# Altium footprint library LDCN Components.PcbLib: 426 footprints (part 15 of 27)
Each footprint in its own frame and in the unit in brackets; x right, y up, seen from the top. Pads: shape width x height; smd on the part's side, far side on the other; paste and mask are expansions set on the pad; w line width, h text height; cw(c..) or ccw(c..) is an arc to the next point about the centre after c.
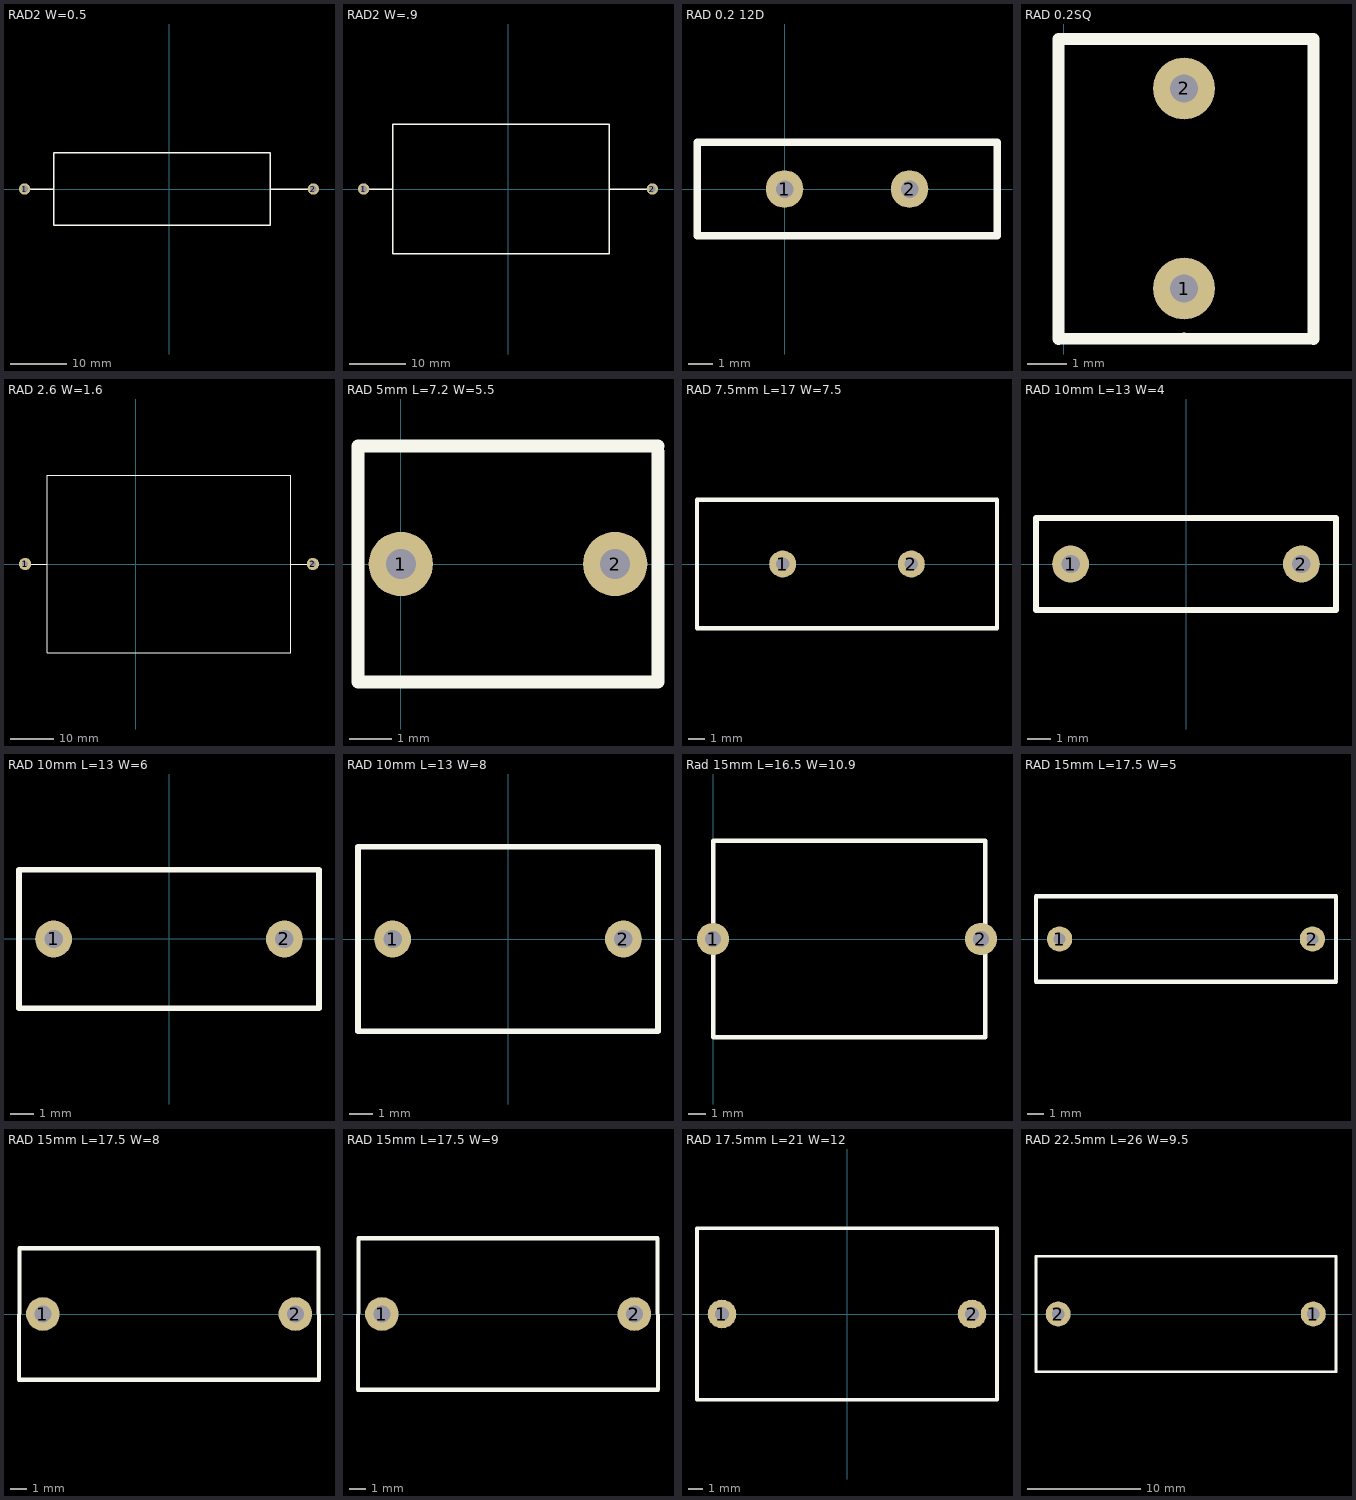
[diagram p14: the footprints below, top view; thin cyan lines are the x and y axes]

## RAD2 W=0.5 [mm]
height 10
pads (2):
  round 2 hole 1.2: 1(-25.4,0) 2(25.4,0)
Top Overlay:
  lines w0.254: -25.4,0 -20.32,0 ; 17.78,0 25.4,0 ; -20.32,-6.35 -20.32,6.35 17.78,6.35 17.78,-6.35 -20.32,-6.35

## RAD2 W=.9 [mm]
height 10
pads (2):
  round 2 hole 1.2: 1(-25.4,0) 2(25.4,0)
Top Overlay:
  lines w0.254: -25.4,0 -20.32,0 ; 17.78,0 25.4,0 ; -20.32,-11.43 -20.32,11.43 17.78,11.43 17.78,-11.43 -20.32,-11.43

## RAD 0.2 12D [mil] "5mm Lead spacing, 12mm Round Diameter"
pads (2):
  round 60 hole 28: 1(0,0) 2(200,0)
Top Overlay:
  lines w12: -140,-75 -140,75 340,75 340,-75 -140,-75

## RAD 0.2SQ [mil]
height 500
pads (2):
  round 62 hole 28: 1(120.5,270.5) 2(120.5,470.5)
Top Overlay:
  lines w12: -5,220 120.5,220.5 250,220 250,520 -5,520 -5,220

## RAD 2.6 W=1.6 [mm]
height 16
pads (2):
  round 2.8 hole 1.4: 1(-25.4,0) 2(40.64,0)
Top Overlay:
  lines w0.254: -25.4,0 -20.32,0 ; 35.56,0 40.64,0 ; -20.32,-20.32 -20.32,20.32 35.56,20.32 35.56,-20.32 -20.32,-20.32

## RAD 5mm L=7.2 W=5.5 [mil]
pads (2):
  round 60 hole 28: 1(0,0) 2(200,0)
Top Overlay:
  lines w12: 240,105 240,-110 -40,-110 -40,110 240,110

## RAD 7.5mm L=17 W=7.5 [mm] "Panasonic ECQP Series"
height 17.5
pads (2):
  round 1.6 hole 0.8: 1(-25.4,0) 2(-17.78,0)
Top Overlay:
  lines w0.254: -30.48,-3.81 -30.48,3.81 -12.7,3.81 -12.7,-3.81 -30.48,-3.81

## RAD 10mm L=13 W=4 [mm] "0.8mm Hole"
height 10
pads (2):
  round 1.6 hole 0.8: 1(-5,0) 2(5,0)
Top Overlay:
  lines w0.254: -6.5,-2 6.5,-2 6.5,2 -6.5,2 -6.5,-2

## RAD 10mm L=13 W=6 [mm] "0.8mm Hole"
height 10
pads (2):
  round 1.6 hole 0.8: 1(-5,0) 2(5,0)
Top Overlay:
  lines w0.254: -6.5,-3 -6.5,3 6.5,3 6.5,-3 -6.5,-3

## RAD 10mm L=13 W=8 [mm] "0.8mm Hole"
height 10
pads (2):
  round 1.6 hole 0.8: 1(-5,0) 2(5,0)
Top Overlay:
  lines w0.254: -6.5,-4 6.5,-4 6.5,4 -6.5,4 -6.5,-4

## Rad 15mm L=16.5 W=10.9 [mm]
pads (2):
  round 1.8 hole 0.9: 1(0,0) 2(15,0)
Top Overlay:
  lines w0.254: 0,-5.5 0,5 0,5.5 15.25,5.5 15.25,-5.5 0,-5.5

## RAD 15mm L=17.5 W=5 [mm] "Vishay MXP 336-2-X2 Series"
height 11
pads (2):
  round 1.5 hole 0.7: 1(-29.083,0) 2(-14.097,0)
Top Overlay:
  lines w0.254: -12.7,-2.54 -30.48,-2.54 -30.48,2.54 -12.7,2.54 -12.7,-2.413

## RAD 15mm L=17.5 W=8 [mm] "BC 468"
height 11
pads (2):
  round 2 hole 1: 1(-29.083,0) 2(-14.097,0)
Top Overlay:
  lines w0.254: -12.72,-3.9 -30.5,-3.9 -30.476,3.9 -12.72,3.9 -12.695,-3.9

## RAD 15mm L=17.5 W=9 [mm] "TDK B32522 1mm Hole"
height 18
pads (2):
  round 2 hole 1: 1(-29.083,0) 2(-14.097,0)
Top Overlay:
  lines w0.254: -30.502,-4.5 -30.474,4.5 -12.722,4.5 -12.693,-4.5 -30.502,-4.5

## RAD 17.5mm L=21 W=12 [mm] "Panasonic ECQ-E, 0.8mm Lead Diameter"
height 22
pads (2):
  round 2 hole 1: 1(-8.75,0) 2(8.75,0)
Top Overlay:
  lines w0.254: -10.5,-6 10.5,-6 10.5,6 -10.5,6 -10.5,-6

## RAD 22.5mm L=26 W=9.5 [mm] "BC MKP 468"
height 22
pads (2):
  round 2.2 hole 1.1: 1(-6,0) 2(-28.448,0)
Top Overlay:
  lines w0.254: -30.4,-5.08 -30.4,5.08 -4,5.08 -4,-5.08 -30.4,-5.08